# Altium footprint library WPME-FISM.PcbLib: 8 footprints
Each footprint in its own frame and in the unit in brackets; x right, y up, seen from the top. Pads: shape width x height; smd on the part's side, far side on the other; paste and mask are expansions set on the pad; w line width, h text height; cw(c..) or ccw(c..) is an arc to the next point about the centre after c.
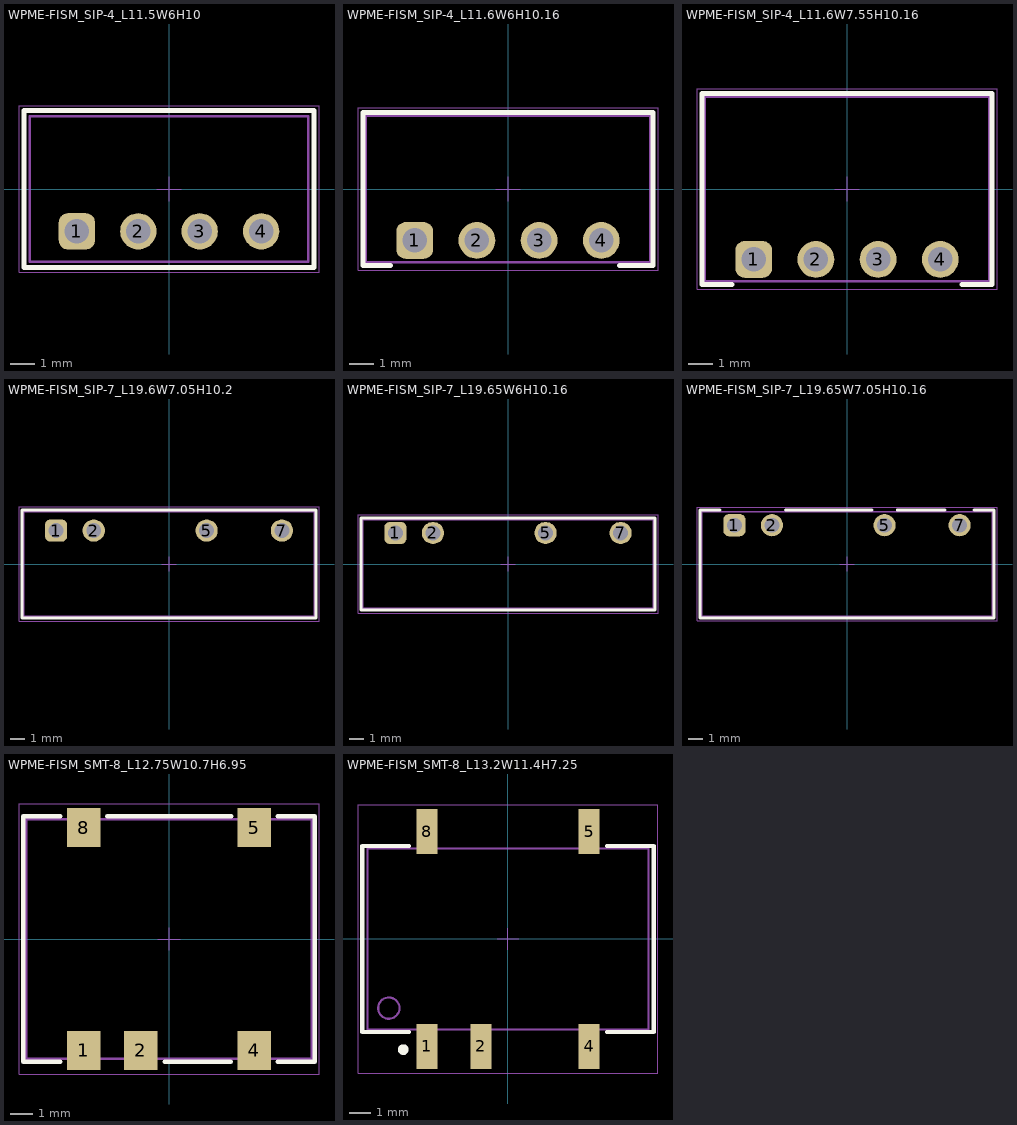
[diagram p0: the footprints below, top view; thin cyan lines are the x and y axes]

## WPME-FISM_SIP-4_L11.5W6H10 [mm] "Fixed Isolated Module, SIP-4, body 11.50x6.00mm"
height 10
pads (4):
  rrect50% 1.5x1.5 hole 1: 1(-3.81,-1.75)
  round 1.5 hole 1: 2(-1.27,-1.75) 3(1.27,-1.75) 4(3.81,-1.75)
Top Overlay:
  lines w0.2: -6,-3.25 -6,3.25 6,3.25 6,-3.25 -6,-3.25
Top Designator:
  text ".Designator" at -7.498,-0.5 h1.5
Top Component Outline:
  lines w0.1: -5.75,-3 5.75,-3 5.75,3 -5.75,3 -5.75,-3
Top 3D Body:
  lines w0.1: -5.75,-3 5.75,-3 5.75,3 -5.75,3 -5.75,-3
Top Courtyard:
  lines w0.05: -0.5,0 0.5,0 ; 0,-0.5 0,0.5 ; -6.2,-3.45 6.2,-3.45 6.2,3.45 -6.2,3.45 -6.2,-3.45
3D body "17792xxx1.stp": height 10.05, standoff -4.05, extent -5.75,-3 5.75,3

## WPME-FISM_SIP-4_L11.6W6H10.16 [mm] "Fixed Isolated Module, SIP-4, body 11.60x6.00mm"
height 10.41
pads (4):
  rrect50% 1.5x1.5 hole 1: 1(-3.81,-2.1)
  round 1.5 hole 1: 2(-1.27,-2.1) 3(1.27,-2.1) 4(3.81,-2.1)
Top Overlay:
  lines w0.2: -4.8,-3.125 -5.925,-3.125 -5.925,3.125 5.925,3.125 5.925,-3.125 4.55,-3.125
Top Designator:
  text ".Designator" at -7.498,-0.5 h1.5
Top Component Outline:
  lines w0.1: -5.8,-3 5.8,-3 5.8,3 -5.8,3 -5.8,-3
Top 3D Body:
  lines w0.1: -5.8,-3 5.8,-3 5.8,3 -5.8,3 -5.8,-3
Top Courtyard:
  lines w0.05: -0.5,0 0.5,0 ; 0,-0.5 0,0.5 ; -6.125,-3.325 6.125,-3.325 6.125,3.325 -6.125,3.325 -6.125,-3.325
3D body "1779205111.stp": height 10.21, standoff -4.05, extent -5.8,-3 5.8,3

## WPME-FISM_SIP-4_L11.6W7.55H10.16 [mm] "Power Module, SIP-4, body 11.60x7.55mm"
height 10.41
pads (4):
  rrect50% 1.5x1.5 hole 1 paste-0.1: 1(-3.81,-2.875)
  round 1.5 hole 1 paste-0.1: 2(-1.27,-2.875) 3(1.27,-2.875) 4(3.81,-2.875)
Top Overlay:
  lines w0.2: -4.7,-3.9 -5.925,-3.9 -5.925,3.9 5.925,3.9 5.925,-3.9 4.7,-3.9
Top Designator:
  text ".Designator" at -7.498,-0.5 h1.5
Top Component Outline:
  lines w0.1: -5.8,-3.775 -5.8,3.775 5.8,3.775 5.8,-3.775 -5.8,-3.775
Top 3D Body:
  lines w0.1: -5.8,-3.775 -5.8,3.775 5.8,3.775 5.8,-3.775 -5.8,-3.775
Top Courtyard:
  lines w0.05: -0.5,0 0.5,0 ; 0,-0.5 0,0.5 ; -6.125,-4.1 -6.125,4.1 6.125,4.1 6.125,-4.1 -6.125,-4.1
3D body "1779405111.stp": height 10.16, standoff -4.1, extent -5.8,-3.775 5.8,3.775

## WPME-FISM_SIP-7_L19.6W7.05H10.2 [mm] "Fixed Isolated Module, SIP-7, body 19.60x7.05mm"
height 10.2
pads (4):
  rrect50% 1.5x1.5 hole 1: 1(-7.62,2.255)
  round 1.5 hole 1: 2(-5.08,2.255) 5(2.54,2.255) 7(7.62,2.255)
Top Overlay:
  lines w0.2: -9.925,-3.65 -9.925,3.65 9.925,3.65 9.925,-3.65 -9.925,-3.65
Top Designator:
  text ".Designator" at -7.498,-0.5 h1.5
Top Component Outline:
  lines w0.1: -9.8,-3.525 -9.8,3.525 9.8,3.525 9.8,-3.525 -9.8,-3.525
Top 3D Body:
  lines w0.1: -9.8,-3.525 -9.8,3.525 9.8,3.525 9.8,-3.525 -9.8,-3.525
Top Courtyard:
  lines w0.05: -0.5,0 0.5,0 ; 0,-0.5 0,0.5 ; -10.125,-3.85 -10.125,3.85 10.125,3.85 10.125,-3.85 -10.125,-3.85
3D body "17792xxx4_new.stp": height 10.25, standoff -4.05, extent -9.8,-3.525 9.8,3.525

## WPME-FISM_SIP-7_L19.65W6H10.16 [mm] "Power Module, SIP7, body 19.65x6.00mm"
height 10.41
pads (4):
  rrect50% 1.5x1.5 hole 1 paste-0.1: 1(-7.62,2.1)
  round 1.5 hole 1 paste-0.1: 2(-5.08,2.1) 5(2.54,2.1) 7(7.62,2.1)
Top Overlay:
  lines w0.2: -9.95,-3.125 -9.95,3.125 9.95,3.125 9.95,-3.125 -9.95,-3.125
Top Designator:
  text ".Designator" at -7.498,-0.5 h1.5
Top Component Outline:
  lines w0.1: -9.825,-3 9.825,-3 9.825,3 -9.825,3 -9.825,-3
Top 3D Body:
  lines w0.1: -9.825,-3 9.825,-3 9.825,3 -9.825,3 -9.825,-3
Top Courtyard:
  lines w0.05: -0.5,0 0.5,0 ; 0,-0.5 0,0.5 ; -10.15,-3.325 -10.15,3.325 10.15,3.325 10.15,-3.325 -10.15,-3.325
3D body "1779205141.stp": height 10.16, standoff -4.1, extent -9.825,-3 9.825,3

## WPME-FISM_SIP-7_L19.65W7.05H10.16 [mm] "Power Module, SIP7, body 19.65x7.05mm"
height 10.41
pads (4):
  rrect50% 1.5x1.5 hole 1 paste-0.1: 1(-7.62,2.625)
  round 1.5 hole 1 paste-0.1: 2(-5.08,2.625) 5(2.54,2.625) 7(7.62,2.625)
Top Overlay:
  lines w0.2: -8.6,3.65 -9.95,3.65 -9.95,-3.65 9.95,-3.65 9.95,3.65 8.6,3.65 ; -4.15,3.65 1.68,3.65 ; 3.4,3.65 6.64,3.65
Top Designator:
  text ".Designator" at -7.498,-0.5 h1.5
Top Component Outline:
  lines w0.1: -9.825,-3.525 9.825,-3.525 9.825,3.525 -9.825,3.525 -9.825,-3.525
Top 3D Body:
  lines w0.1: -9.825,-3.525 9.825,-3.525 9.825,3.525 -9.825,3.525 -9.825,-3.525
Top Courtyard:
  lines w0.05: -0.5,0 0.5,0 ; 0,-0.5 0,0.5 ; -10.15,-3.85 -10.15,3.85 10.15,3.85 10.15,-3.85 -10.15,-3.85
3D body "1779405141.stp": height 10.16, standoff -4.1, extent -9.825,-3.525 9.825,3.525

## WPME-FISM_SMT-8_L12.75W10.7H6.95 [mm] "Fixed Isolated Module, SMT-8, body 12.75x10.70mm"
height 6.95
pads (5):
  rect 1.5x1.75 smd paste-403.566: 1(-3.81,-4.975) 2(-1.27,-4.975) 4(3.81,-4.975) 5(3.81,4.975) 8(-3.81,4.975)
Top Overlay:
  lines w0.2: -4.85,-5.475 -6.5,-5.475 -6.5,5.475 -4.85,5.475 ; -2.75,5.475 2.77,5.475 ; -0.2,-5.475 2.75,-5.475 ; 4.85,-5.475 6.5,-5.475 6.5,5.475 4.85,5.475
Top Paste:
  region: -4.46,-4.2 -3.16,-4.2 -3.16,-5.75 -4.46,-5.75
  region: -1.92,-4.2 -0.62,-4.2 -0.62,-5.75 -1.92,-5.75
  region: 3.16,-4.2 4.46,-4.2 4.46,-5.75 3.16,-5.75
  region: 3.16,5.75 4.46,5.75 4.46,4.2 3.16,4.2
  region: -4.46,5.75 -3.16,5.75 -3.16,4.2 -4.46,4.2
Top Designator:
  text ".Designator" at -7.498,-0.5 h1.5
Top Component Outline:
  lines w0.1: -6.375,-5.35 6.375,-5.35 6.375,5.35 -6.375,5.35 -6.375,-5.35
Top 3D Body:
  lines w0.1: -6.375,-5.35 6.375,-5.35 6.375,5.35 -6.375,5.35 -6.375,-5.35
Top Courtyard:
  lines w0.05: -0.5,0 0.5,0 ; 0,-0.5 0,0.5 ; -6.7,-6.05 -6.7,6.05 6.7,6.05 6.7,-6.05 -6.7,-6.05
3D body "FISM_SMT-8.stp": height 6.95, standoff 0, extent -6.336,-5.575 6.414,5.525

## WPME-FISM_SMT-8_L13.2W11.4H7.25 [mm] "Power Module, SMT, body 13.20x11.40mm"
height 7.5
pads (5):
  rect 1x2.1 smd: 1(-3.81,-5.05) 2(-1.27,-5.05) 4(3.81,-5.05) 5(3.81,5.05) 8(-3.81,5.05)
Top Overlay:
  circle w0.25: c-4.925,-5.2 r0.125
  lines w0.2: -4.65,-4.375 -6.85,-4.375 -6.85,4.375 -4.65,4.375 ; 4.65,-4.375 6.85,-4.375 6.85,4.375 4.65,4.375
Top Designator:
  text ".Designator" at -7.498,-0.5 h1.5
Top Component Outline:
  circle w0.1: c-5.6,-3.25 r0.5
  lines w0.1: -4.11,-4.25 -4.11,-5.7 -3.51,-5.7 -3.51,-4.25 ; -4.11,4.25 -4.11,5.7 -3.51,5.7 -3.51,4.25 ; -1.57,-4.25 -1.57,-5.7 -0.97,-5.7 -0.97,-4.25 ; 3.51,-4.25 3.51,-5.7 4.11,-5.7 4.11,-4.25 ; 3.51,4.25 3.51,5.7 4.11,5.7 4.11,4.25 ; -6.6,-4.25 6.6,-4.25 6.6,4.25 -6.6,4.25 -6.6,-4.25
Top 3D Body:
  circle w0.1: c-5.6,-3.25 r0.5
  lines w0.1: -4.11,-4.25 -4.11,-5.7 -3.51,-5.7 -3.51,-4.25 ; -4.11,4.25 -4.11,5.7 -3.51,5.7 -3.51,4.25 ; -1.57,-4.25 -1.57,-5.7 -0.97,-5.7 -0.97,-4.25 ; 3.51,-4.25 3.51,-5.7 4.11,-5.7 4.11,-4.25 ; 3.51,4.25 3.51,5.7 4.11,5.7 4.11,4.25 ; -6.6,-4.25 6.6,-4.25 6.6,4.25 -6.6,4.25 -6.6,-4.25
Top Courtyard:
  lines w0.05: -0.5,0 0.5,0 ; 0,-0.5 0,0.5 ; -7.05,-6.3 -7.05,6.3 7.05,6.3 7.05,-6.3 -7.05,-6.3
3D body "1769205141.stp": height 7.25, standoff 0, extent -6.6,-5.702 6.6,5.702